# Altium footprint library mastermind.PCBLIB: 1061 footprints (part 50 of 67)
Each footprint in its own frame and in the unit in brackets; x right, y up, seen from the top. Pads: shape width x height; smd on the part's side, far side on the other; paste and mask are expansions set on the pad; w line width, h text height; cw(c..) or ccw(c..) is an arc to the next point about the centre after c.
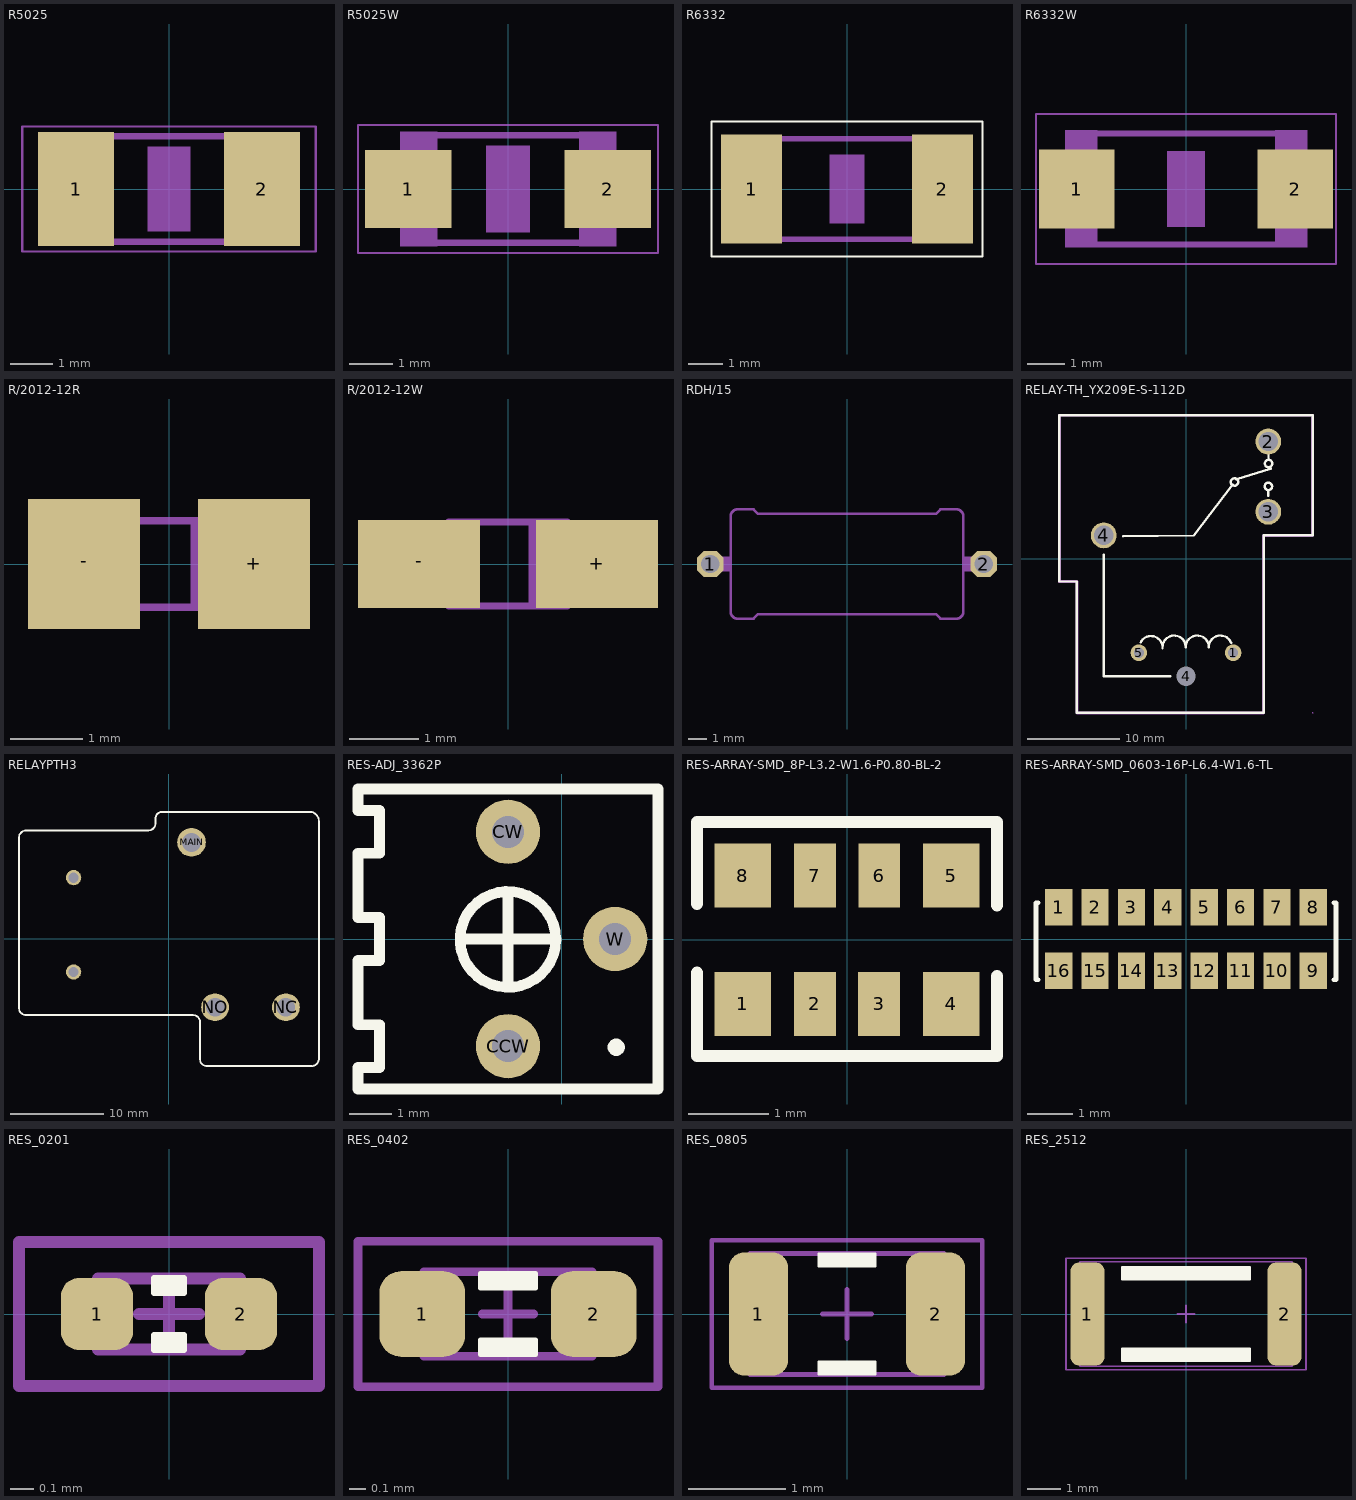
[diagram p49: the footprints below, top view; thin cyan lines are the x and y axes]

## R5025 [mm]
pads (2):
  rect 1.8x2.7 smd: 1(-2.2,0) 2(2.2,0)
Mechanical 2:
  lines w0.152: -0.9,1.245 0.9,1.245 ; -0.875,-1.245 0.925,-1.245
Mechanical 8:
  region: 1.651,-1.321 1.651,1.329 2.501,1.329 2.501,-1.321
  region: -2.489,-1.321 -2.489,1.329 -1.639,1.329 -1.639,-1.321
  lines w0.152: -1.662,1.245 1.662,1.245 ; -1.637,-1.245 1.687,-1.245
Mechanical 30:
  region: -0.5,-1 -0.5,1 0.5,1 0.5,-1
Mechanical 29 (Mech34):
  lines w0.051: -3.473,-1.483 -3.473,1.483 3.473,1.483 3.473,-1.483 -3.473,-1.483

## R5025W [mm]
pads (2):
  rect 2x1.8 smd: 1(-2.311,0) 2(2.311,0)
Mechanical 2:
  lines w0.152: -1.662,1.245 1.662,1.245 ; -1.637,-1.245 1.687,-1.245
Mechanical 8:
  region: -2.489,-1.321 -2.489,1.329 -1.639,1.329 -1.639,-1.321
  region: 1.651,-1.321 1.651,1.329 2.501,1.329 2.501,-1.321
Mechanical 30:
  region: -0.5,-1 -0.5,1 0.5,1 0.5,-1
Mechanical 29 (Mech34):
  lines w0.051: -3.473,-1.483 3.473,-1.483 3.473,1.483 -3.473,1.483 -3.473,-1.483

## R6332 [mm]
pads (2):
  rect 1.8x3.2 smd: 1(-2.8,0) 2(2.8,0)
Top Overlay:
  lines w0.051: -3.973,-1.983 3.973,-1.983 3.973,1.983 -3.973,1.983 -3.973,-1.983
Mechanical 2:
  lines w0.152: -1.473,-1.473 1.498,-1.473 ; -1.473,1.473 1.498,1.473
Mechanical 8:
  region: 2.362,-1.549 2.362,1.551 3.212,1.551 3.212,-1.549
  region: -3.2,-1.549 -3.2,1.551 -2.351,1.551 -2.351,-1.549
  lines w0.152: -2.362,-1.473 2.387,-1.473 ; -2.362,1.473 2.387,1.473
Mechanical 30:
  region: -0.5,-1 -0.5,1 0.5,1 0.5,-1

## R6332W [mm]
pads (2):
  rect 2x2.1 smd: 1(-2.896,0) 2(2.896,0)
Mechanical 2:
  lines w0.152: -2.362,-1.473 2.387,-1.473 ; -2.362,1.473 2.387,1.473
Mechanical 8:
  region: -3.2,-1.549 -3.2,1.551 -2.351,1.551 -2.351,-1.549
  region: 2.362,-1.549 2.362,1.551 3.212,1.551 3.212,-1.549
Mechanical 30:
  region: -0.5,-1 -0.5,1 0.5,1 0.5,-1
Mechanical 29 (Mech34):
  lines w0.051: -3.973,-1.983 3.973,-1.983 3.973,1.983 -3.973,1.983 -3.973,-1.983

## R/2012-12R [mm]
pads (2):
  rect 1.55x1.8 smd: +(1.175,0) -(-1.175,0)
Mechanical 8:
  region: -1,-0.45 -1,0.45 -0.875,0.45 -0.875,-0.45
  region: 0.875,-0.45 0.875,0.45 1,0.45 1,-0.45
  region: 0.3,-0.625 0.3,0.625 0.5,0.625 0.5,-0.625
  lines w0.102: -0.85,-0.6 0.85,-0.6 0.85,0.6 -0.85,0.6 -0.85,-0.6

## R/2012-12W [mm]
pads (2):
  rect 1.75x1.26 smd: +(1.275,0) -(-1.275,0)
Mechanical 8:
  region: 0.3,-0.625 0.3,0.625 0.5,0.625 0.5,-0.625
  region: 0.875,-0.45 0.875,0.45 1,0.45 1,-0.45
  region: -1,-0.45 -1,0.45 -0.875,0.45 -0.875,-0.45
  lines w0.102: -0.85,-0.6 -0.85,0.6 0.85,0.6 0.85,-0.6 -0.85,-0.6

## RDH/15 [mil]
pads (2):
  oct 58.09x58.09 hole 40: 1(-300,0) 2(300,0)
Mechanical 2:
  lines w6: -255,-40 -255,-105 ccw(c-240,-105) -240,-120 -205,-120 -195,-110 195,-110 205,-120 240,-120 ccw(c240,-105) 255,-105 255,-40 ; -255,40 -255,105 cw(c-240,105) -240,120 -205,120 -195,110 195,110 205,120 240,120 cw(c240,105) 255,105 255,40
Mechanical 8:
  region: -266,-16 -266,16 -254,16 -254,-16
  region: 254,-16 254,16 266,16 266,-16
  lines w6: -255,-40 -255,40 ; 255,-40 255,40
  lines w32: -300,0 -270,0 ; 270,0 300,0

## RELAY-TH_YX209E-S-112D [mm]
pads (6):
  round 1.8 hole 1.1 paste-2539.97 mask+0.05: 1(5.1,-10.15) 5(-5.1,-10.15)
  round 2.8 / inner round 4.6 / far side round 4.6 hole 2.1 paste-2539.97 mask+0.05: 2(8.9,12.7) 3(8.9,5.1) 4(-8.9,2.55)
  round 2 hole 2.1 paste-2539.97 mask+0.05: 4(0,-12.7)
Top Overlay:
  circle w0.254: c8.932,10.32 r0.401
  circle w0.254: c8.912,7.847 r0.401
  circle w0.254: c5.242,8.32 r0.401
  lines w0.051: -13.7,2.55 -13.7,-2.45 -11.8,-2.45 -11.8,-16.65 8.4,-16.65 8.4,2.55 13.7,2.55 13.7,15.55 -8.7,15.55 ; -13.7,2.55 -13.7,2.55 ; -13.7,2.55 -13.7,15.55 ; -13.7,15.55 -13.7,15.55 ; -13.7,15.55 -8.7,15.55 ; -8.7,15.55 -8.7,15.55
  lines w0.254: -8.9,0.48 -8.9,-12.7 -1.7,-12.7 ; -6.816,2.446 0.862,2.54 5.042,8.02 ; -4.92,-9.049 cw(c-3.791,-9.598) -2.537,-9.659 ; -2.537,-9.56 cw(c-1.286,-9.537) -0.037,-9.461 ; -0.037,-9.56 cw(c1.213,-9.537) 2.462,-9.461 ; 2.462,-9.56 cw(c3.713,-9.537) 4.878,-9.082 ; 5.452,8.632 9.166,9.752 ; 8.912,6.844 8.912,7.446 ; 8.932,10.721 8.932,11.336 ; -13.7,-2.45 -13.7,15.55 13.7,15.55 13.7,2.55 8.4,2.55 8.4,-16.65 -11.8,-16.65 -11.8,-2.45 -13.7,-2.45
Mechanical 6:
  region: 13.7,15.423 -13.573,15.423 -13.573,-2.323 -11.8,-2.323 -11.775,-2.323 -11.728,-2.342 -11.692,-2.378 -11.673,-2.425 -11.673,-2.45 -11.673,-16.523 8.273,-16.523 8.273,2.55 8.273,2.575 8.292,2.622 8.328,2.658 8.375,2.677 8.4,2.677 13.573,2.677 13.573,15.25 13.573,15.303 13.647,15.377 13.753,15.377 13.827,15.303 13.827,15.25 13.827,2.55 13.827,2.525 13.808,2.478 13.772,2.442 13.725,2.423 13.7,2.423 8.527,2.423 8.527,-16.65 8.527,-16.675 8.508,-16.722 8.472,-16.758 8.425,-16.777 8.4,-16.777 -11.8,-16.777 -11.825,-16.777 -11.872,-16.758 -11.908,-16.722 -11.927,-16.675 -11.927,-16.65 -11.927,-2.577 -13.7,-2.577 -13.725,-2.577 -13.772,-2.558 -13.808,-2.522 -13.827,-2.475 -13.827,-2.45 -13.827,15.55 -13.827,15.575 -13.808,15.622 -13.772,15.658 -13.725,15.677 -13.7,15.677 13.7,15.677 13.753,15.677 13.827,15.603 13.827,15.497 13.753,15.423
Mechanical 15:
  region: 8.1,12.3 8.1,13.1 9.7,13.1 9.7,12.3
  region: 8.1,4.7 8.1,5.5 9.7,5.5 9.7,4.7
  region: -9.5,3.15 -8.3,3.15 -8.3,1.95 -9.5,1.95
  region: -5.4,-9.85 -4.8,-9.85 -4.8,-10.45 -5.4,-10.45
  region: 4.8,-9.85 5.4,-9.85 5.4,-10.45 4.8,-10.45
  region: -0.6,-12.1 0.6,-12.1 0.6,-13.3 -0.6,-13.3
  region: 13.76,-16.65 13.759,-16.626 13.724,-16.592 13.676,-16.592 13.641,-16.626 13.64,-16.65 13.641,-16.674 13.676,-16.708 13.724,-16.708 13.759,-16.674
3D body "RELAY-RT1-24-30-A.SLDPRT": height 20.2, standoff -2.8, extent -13.5,-16.5 13.5,15.5

## RELAYPTH3 [mm]
pads (5):
  round 1.65 / inner round 1.524 / far side round 1.65 hole 1.1: COIL1(-10.225,6.575) COIL2(-10.225,-3.585)
  round 3.086 / inner round 1.524 / far side round 3.086 hole 2.057: MAIN(2.475,10.375)
  round 3 / inner round 1.524 / far side round 3 hole 2: NC(12.645,-7.385) NO(5.015,-7.385)
Top Overlay:
  lines w0.203: -16.105,-7.535 ccw(c-15.336,-7.463) -15.355,-8.235 2.645,-8.235 cw(c2.626,-9.007) 3.395,-8.935 3.395,-13.035 ccw(c4.164,-12.963) 4.145,-13.735 15.285,-13.735 ccw(c15.365,-12.894) 16.195,-12.735 16.195,12.665 ccw(c15.178,12.653) 15.285,13.665 -0.655,13.665 ccw(c-0.689,12.949) -1.405,12.965 -1.405,12.365 cw(c-2.174,12.437) -2.155,11.665 -15.455,11.665 ccw(c-15.313,10.882) -16.105,10.965 -16.105,-7.535

## RES-ADJ_3362P [mil]
pads (3):
  round 60 hole 30: CCW(-50,-100) CW(-50,100) W(50,0)
Top Overlay:
  lines w10: -90,0 -10,0 ; -50,-40 -50,40 ; -30,-140 90,-140 90,140 -30,140 -170,140 -190,140 -190,120 -170,120 -170,80 -190,80 -190,20 -170,20 -170,-20 -190,-20 -190,-80 -170,-80 -170,-120 -190,-120 -190,-140 -170,-140 -10,-140 ; -5.3,-0.8 cw(c-50.02,-0.4) -5.3,0 ; 54,-101.1 cw(c51,-101.05) 54,-101

## RES-ARRAY-SMD_8P-L3.2-W1.6-P0.80-BL-2 [mm]
pads (8):
  rect 0.7x0.8 smd paste+0 mask+0.051: 1(-1.3,-0.8) 4(1.3,-0.8) 5(1.3,0.8) 8(-1.3,0.8)
  rect 0.52x0.8 smd paste+0 mask+0.051: 2(-0.4,-0.8) 3(0.4,-0.8) 6(0.4,0.8) 7(-0.4,0.8)
Top Overlay:
  lines w0.152: -1.87,-0.41 -1.87,-1.45 1.87,-1.45 1.87,-0.45 ; -1.87,0.45 -1.87,1.47 1.87,1.47 1.87,0.43
3D body "YC164_RESPACK.stp": height 0.61, standoff 0, extent -1.602,-0.8 1.598,0.8

## RES-ARRAY-SMD_0603-16P-L6.4-W1.6-TL [mm]
pads (16):
  rect 0.6x0.8 smd paste+0 mask+0.05: 1(-2.8,0.7) 2(-2,0.7) 3(-1.2,0.7) 4(-0.4,0.7) 5(0.4,0.7) 6(1.2,0.7) 7(2,0.7) 8(2.8,0.7) 9(2.8,-0.7) 10(2,-0.7) 11(1.2,-0.7) 12(0.4,-0.7) 13(-0.4,-0.7) 14(-1.2,-0.7) 15(-2,-0.7) 16(-2.8,-0.7)
Top Overlay:
  lines w0.1: -3.254,-0.9 -3.3,-0.9 -3.3,0.8 -3.254,0.8 ; 3.254,-0.9 3.3,-0.9 3.3,0.8 3.254,0.8

## RES_0201 [mil]
height 9.06
pads (2):
  rrect50% 12x12 smd: 1(-12,0) 2(12,0)
Top Overlay:
  region: 2.5,-6 -2.5,-6 -2.5,-3.5 2.5,-3.5
  region: -2.5,6 2.5,6 2.5,3.5 -2.5,3.5
  lines w1: -2.5,-6 2.5,-6 2.5,-3.5 -2.5,-3.5 -2.5,-6 ; -2.5,3.5 -2.5,6 2.5,6 2.5,3.5 -2.5,3.5
Mechanical 13:
  lines w2: -5,0 5,0 ; 0,-5 0,5 ; -11.81,-5.91 11.81,-5.91 11.81,5.91 -11.81,5.91 -11.81,-5.91
Mechanical 14:
  lines w2: -25,-12 25,-12 25,12 -25,12 -25,-12
  text ".Designator" at -13,-8 h30
3D body "RESC0603X02L.step": height 9.06, standoff 0, extent -11.81,-5.9 11.81,5.91

## RES_0402 [mil]
height 13.78
pads (2):
  rrect50% 20x20 smd: 1(-20,0) 2(20,0)
Top Overlay:
  region: 6.5,-9.5 -6.5,-9.5 -6.5,-6 6.5,-6
  region: -6.5,9.5 6.5,9.5 6.5,6 -6.5,6
  lines w1: -6.5,-9.5 6.5,-9.5 6.5,-6 -6.5,-6 -6.5,-9.5 ; -6.5,6 -6.5,9.5 6.5,9.5 6.5,6 -6.5,6
Mechanical 13:
  lines w2: -6,0 6,0 ; 0,-6 0,6 ; -19.69,-9.84 -19.69,9.84 19.68,9.84 19.68,-9.84 -19.69,-9.84
Mechanical 14:
  lines w2: -35,-17 35,-17 35,17 -35,17 -35,-17
  text ".Designator" at -15,-10 h40
3D body "RESC1005X03L.step": height 13.78, standoff 0, extent -19.68,-9.84 19.69,9.85

## RES_0805 [mil]
height 23.62
pads (2):
  rrect50% 24x50 smd: 1(-36,0) 2(36,0)
Top Overlay:
  region: 11.5,-24.5 -11.5,-24.5 -11.5,-19.5 11.5,-19.5
  region: -11.5,24.5 11.5,24.5 11.5,19.5 -11.5,19.5
  lines w1: -11.5,-24.5 11.5,-24.5 11.5,-19.5 -11.5,-19.5 -11.5,-24.5 ; -11.5,19.5 -11.5,24.5 11.5,24.5 11.5,19.5 -11.5,19.5
Mechanical 13:
  lines w2: -10,0 10,0 ; 0,-10 0,10 ; -39.37,-24.61 39.37,-24.61 39.37,24.61 -39.37,24.61 -39.37,-24.61
Mechanical 14:
  lines w2: -55,-30 -55,30 55,30 55,-30 -55,-30
  text ".Designator" at -31,-20 h80
3D body "RESC2012X06L.step": height 23.62, standoff 0, extent -39.37,-24.6 39.37,24.61

## RES_2512 [mil]
height 23.62
pads (2):
  rrect50% 40x120 smd: 1(-115,0) 2(115,0)
Top Overlay:
  region: 75,-40 -75,-40 -75,-55 75,-55
  region: -75,40 75,40 75,55 -75,55
  lines w2: -75,-55 75,-55 75,-40 -75,-40 -75,-55 ; -75,40 -75,55 75,55 75,40 -75,40
Mechanical 13:
  lines w2: -10,0 10,0 ; 0,-10 0,10 ; -124.02,-61.02 124.02,-61.02 124.02,61.02 -124.02,61.02 -124.02,-61.02
Mechanical 14:
  lines w2: -140,-65 -140,65 140,65 140,-65 -140,-65
  text ".Designator" at -31,-20 h80